# Altium schematic symbol library SCHLIB.SchLib: 2608 symbols (part 14 of 20) (continued)
## R-14R-0402 (continued)
RES 14 OHM 1% 1/16W 0402; Manufacturer Part Number: RC0402FR-0714RL; Manufacturer: YAGEO; Tolerance: 0.01; Power: 0.063W; Temperature Coefficient: ±100ppm/°C; Object  Type: Part; Design Item ID: R-14R-0402; Value: 14R; Composition: Thick Film; Features: Moisture Resistant; Operating Temperature: -55°C ~ 155°C; Height - Seated (Max): 0.40mm; Category: Resistor
footprint R0402
pins: 1, 2

## R-14R-0603
designator R?, comment Package: 0603  (hidden comment: 14R)
RES SMD 14 OHM 1% 1/10W 0603; Manufacturer Part Number: CRCW060314R0FKEA; Manufacturer: Vishay Dale; Tolerance: 0.01; Power: 0.1W; Temperature Coefficient: ±100ppm/°C; Object  Type: Part; Design Item ID: R-14R-0603; Value: 14R; Composition: Thick Film; Features: Automotive AEC-Q200; Operating Temperature: -55°C ~ 155°C; Height - Seated (Max): 0.50mm; Category: Resistor
footprint R0603
pins: 1, 2

## R-15.4K-0402
designator R?, comment Package: 0402  (hidden comment: 15.4K)
RES 15.4K OHM 1% 1/16W 0402; Manufacturer Part Number: RC0402FR-0715K4L; Manufacturer: YAGEO; Tolerance: 0.01; Power: 0.063W; Temperature Coefficient: ±100ppm/°C; Object  Type: Part; Design Item ID: R-15.4K-0402; Value: 15.4K; Composition: Thick Film; Features: Moisture Resistant; Operating Temperature: -55°C ~ 155°C; Height - Seated (Max): 0.40mm; Category: Resistor
footprint R0402
pins: 1, 2

## R-15.4K-0603
designator R?, comment Package: 0603  (hidden comment: 15.4K)
RES SMD 15.4K OHM 1% 1/10W 0603; Manufacturer Part Number: CRCW060315K4FKEA; Manufacturer: Vishay Dale; Tolerance: 0.01; Power: 0.1W; Temperature Coefficient: ±100ppm/°C; Object  Type: Part; Design Item ID: R-15.4K-0603; Value: 15.4K; Composition: Thick Film; Features: Automotive AEC-Q200; Operating Temperature: -55°C ~ 155°C; Height - Seated (Max): 0.50mm; Category: Resistor
footprint R0603
pins: 1, 2

## R-15.4R-0402
designator R?, comment Package: 0402  (hidden comment: 15.4R)
RES 15.4 OHM 1% 1/16W 0402; Manufacturer Part Number: RC0402FR-0715R4L; Manufacturer: YAGEO; Tolerance: 0.01; Power: 0.063W; Temperature Coefficient: ±100ppm/°C; Object  Type: Part; Design Item ID: R-15.4R-0402; Value: 15.4R; Composition: Thick Film; Features: Moisture Resistant; Operating Temperature: -55°C ~ 155°C; Height - Seated (Max): 0.40mm; Category: Resistor
footprint R0402
pins: 1, 2

## R-15.4R-0603
designator R?, comment Package: 0603  (hidden comment: 15.4R)
RES SMD 15.4 OHM 1% 1/10W 0603; Manufacturer Part Number: CRCW060315R4FKEA; Manufacturer: Vishay Dale; Tolerance: 0.01; Power: 0.1W; Temperature Coefficient: ±100ppm/°C; Object  Type: Part; Design Item ID: R-15.4R-0603; Value: 15.4R; Composition: Thick Film; Features: Automotive AEC-Q200; Operating Temperature: -55°C ~ 155°C; Height - Seated (Max): 0.50mm; Category: Resistor
footprint R0603
pins: 1, 2

## R-15.8K-0402
designator R?, comment Package: 0402  (hidden comment: 15.8K)
RES 15.8K OHM 1% 1/16W 0402; Manufacturer Part Number: RC0402FR-0715K8L; Manufacturer: YAGEO; Tolerance: 0.01; Power: 0.063W; Temperature Coefficient: ±100ppm/°C; Object  Type: Part; Design Item ID: R-15.8K-0402; Value: 15.8K; Composition: Thick Film; Features: Moisture Resistant; Operating Temperature: -55°C ~ 155°C; Height - Seated (Max): 0.40mm; Category: Resistor
footprint R0402
pins: 1, 2

## R-15.8K-0603
designator R?, comment Package: 0603  (hidden comment: 15.8K)
RES SMD 15.8K OHM 1% 1/10W 0603; Manufacturer Part Number: CRCW060315K8FKEA; Manufacturer: Vishay Dale; Tolerance: 0.01; Power: 0.1W; Temperature Coefficient: ±100ppm/°C; Object  Type: Part; Design Item ID: R-15.8K-0603; Value: 15.8K; Composition: Thick Film; Features: Automotive AEC-Q200; Operating Temperature: -55°C ~ 155°C; Height - Seated (Max): 0.50mm; Category: Resistor
footprint R0603
pins: 1, 2

## R-15.8R-0402
designator R?, comment Package: 0402  (hidden comment: 15.8R)
RES 15.8 OHM 1% 1/16W 0402; Manufacturer Part Number: RC0402FR-0715R8L; Manufacturer: YAGEO; Tolerance: 0.01; Power: 0.063W; Temperature Coefficient: ±100ppm/°C; Object  Type: Part; Design Item ID: R-15.8R-0402; Value: 15.8R; Composition: Thick Film; Features: Moisture Resistant; Operating Temperature: -55°C ~ 155°C; Height - Seated (Max): 0.40mm; Category: Resistor
footprint R0402
pins: 1, 2

## R-15K-0402
designator R?, comment Package: 0402  (hidden comment: 15K)
RES 15K OHM 1% 1/16W 0402; Manufacturer Part Number: RC0402FR-0715KL; Manufacturer: YAGEO; Tolerance: 0.01; Power: 0.063W; Temperature Coefficient: ±100ppm/°C; Object  Type: Part; Design Item ID: R-15K-0402; Value: 15K; Composition: Thick Film; Features: Moisture Resistant; Operating Temperature: -55°C ~ 155°C; Height - Seated (Max): 0.40mm; Category: Resistor
footprint R0402
pins: 1, 2

## R-15K-0603
designator R?, comment Package: 0603  (hidden comment: 15K)
RES SMD 15K OHM 1% 1/10W 0603; Manufacturer Part Number: CRCW060315K0FKEA; Manufacturer: Vishay Dale; Tolerance: 0.01; Power: 0.1W; Temperature Coefficient: ±100ppm/°C; Object  Type: Part; Design Item ID: R-15K-0603; Value: 15K; Composition: Thick Film; Features: Automotive AEC-Q200; Operating Temperature: -55°C ~ 155°C; Height - Seated (Max): 0.50mm; Category: Resistor
footprint R0603
pins: 1, 2

## R-15mR-1206
designator R?, comment Package: 1206  (hidden comment: 15mR)
RES 0.015 OHM 1% 1/4W 1206; Manufacturer Part Number: WSL1206R0150FEA; Manufacturer: Vishay Dale; Tolerance: 0.01; Power: 0.25W; Temperature Coefficient: ±75ppm/°C; Object  Type: Part; Design Item ID: R-15mR-1206; Value: 15mR; Composition: Metal Element; Features: Anti-Sulfur, Automotive AEC-Q200, Current Sense, Moisture Resistant, Pulse Withstanding; Operating Temperature: -65°C ~ 170°C; Height - Seated (Max): 0.89mm; Category: Resistor
footprint R1206
pins: 1, 2

## R-15mR-2512
designator R?, comment Package: 2512  (hidden comment: 15mR)
RES 0.015 OHM 1% 1W 2512; Manufacturer Part Number: WSL2512R0150FEA; Manufacturer: Vishay Dale; Tolerance: 0.01; Temperature Coefficient: ±75ppm/°C; Object  Type: Part; Design Item ID: R-15mR-2512; Value: 15mR; Power: 1W; Composition: Metal Element; Features: Anti-Sulfur, Automotive AEC-Q200, Current Sense, Moisture Resistant, Pulse Withstanding; Operating Temperature: -65°C ~ 170°C; Height - Seated (Max): 0.89mm; Category: Resistor
footprint R2512
pins: 1, 2

## R-15R-0402
designator R?, comment Package: 0402  (hidden comment: 15R)
RES 15 OHM 1% 1/16W 0402; Manufacturer Part Number: RC0402FR-0715RL; Manufacturer: YAGEO; Tolerance: 0.01; Power: 0.063W; Temperature Coefficient: ±100ppm/°C; Object  Type: Part; Design Item ID: R-15R-0402; Value: 15R; Composition: Thick Film; Features: Moisture Resistant; Operating Temperature: -55°C ~ 155°C; Height - Seated (Max): 0.40mm; Category: Resistor
footprint R0402
pins: 1, 2

## R-15R-0603
designator R?, comment Package: 0603  (hidden comment: 15R)
RES SMD 15 OHM 1% 1/10W 0603; Manufacturer Part Number: CRCW060315R0FKEA; Manufacturer: Vishay Dale; Tolerance: 0.01; Power: 0.1W; Temperature Coefficient: ±100ppm/°C; Object  Type: Part; Design Item ID: R-15R-0603; Value: 15R; Composition: Thick Film; Features: Automotive AEC-Q200; Operating Temperature: -55°C ~ 155°C; Height - Seated (Max): 0.50mm; Category: Resistor
footprint R0603
pins: 1, 2

## R-16.2K-0402
designator R?, comment Package: 0402  (hidden comment: 16.2K)
RES 16.2K OHM 1% 1/16W 0402; Manufacturer Part Number: RC0402FR-0716K2L; Manufacturer: YAGEO; Tolerance: 0.01; Power: 0.063W; Temperature Coefficient: ±100ppm/°C; Object  Type: Part; Design Item ID: R-16.2K-0402; Value: 16.2K; Composition: Thick Film; Features: Moisture Resistant; Operating Temperature: -55°C ~ 155°C; Height - Seated (Max): 0.40mm; Category: Resistor
footprint R0402
pins: 1, 2

## R-16.2K-0603
designator R?, comment Package: 0603  (hidden comment: 16.2K)
RES SMD 16.2K OHM 1% 1/10W 0603; Manufacturer Part Number: CRCW060316K2FKEA; Manufacturer: Vishay Dale; Tolerance: 0.01; Power: 0.1W; Temperature Coefficient: ±100ppm/°C; Object  Type: Part; Design Item ID: R-16.2K-0603; Value: 16.2K; Composition: Thick Film; Features: Automotive AEC-Q200; Operating Temperature: -55°C ~ 155°C; Height - Seated (Max): 0.50mm; Category: Resistor
footprint R0603
pins: 1, 2

## R-16.2R-0402
designator R?, comment Package: 0402  (hidden comment: 16.2R)
RES 16.2 OHM 1% 1/16W 0402; Manufacturer Part Number: RC0402FR-0716R2L; Manufacturer: YAGEO; Tolerance: 0.01; Power: 0.063W; Temperature Coefficient: ±100ppm/°C; Object  Type: Part; Design Item ID: R-16.2R-0402; Value: 16.2R; Composition: Thick Film; Features: Moisture Resistant; Operating Temperature: -55°C ~ 155°C; Height - Seated (Max): 0.40mm; Category: Resistor
footprint R0402
pins: 1, 2

## R-16.2R-0603
designator R?, comment Package: 0603  (hidden comment: 16.2R)
RES SMD 16.2 OHM 1% 1/10W 0603; Manufacturer Part Number: CRCW060316R2FKEA; Manufacturer: Vishay Dale; Tolerance: 0.01; Power: 0.1W; Temperature Coefficient: ±100ppm/°C; Object  Type: Part; Design Item ID: R-16.2R-0603; Value: 16.2R; Composition: Thick Film; Features: Automotive AEC-Q200; Operating Temperature: -55°C ~ 155°C; Height - Seated (Max): 0.50mm; Category: Resistor
footprint R0603
pins: 1, 2

## R-16.5K-0402
designator R?, comment Package: 0402  (hidden comment: 16.5K)
RES 16.5K OHM 1% 1/16W 0402; Manufacturer Part Number: RC0402FR-0716K5L; Manufacturer: YAGEO; Tolerance: 0.01; Power: 0.063W; Temperature Coefficient: ±100ppm/°C; Object  Type: Part; Design Item ID: R-16.5K-0402; Value: 16.5K; Composition: Thick Film; Features: Moisture Resistant; Operating Temperature: -55°C ~ 155°C; Height - Seated (Max): 0.40mm; Category: Resistor
footprint R0402
pins: 1, 2

## R-16.5K-0603
designator R?, comment Package: 0603  (hidden comment: 16.5K)
RES SMD 16.5K OHM 1% 1/10W 0603; Manufacturer Part Number: CRCW060316K5FKEA; Manufacturer: Vishay Dale; Tolerance: 0.01; Power: 0.1W; Temperature Coefficient: ±100ppm/°C; Object  Type: Part; Design Item ID: R-16.5K-0603; Value: 16.5K; Composition: Thick Film; Features: Automotive AEC-Q200; Operating Temperature: -55°C ~ 155°C; Height - Seated (Max): 0.50mm; Category: Resistor
footprint R0603
pins: 1, 2

## R-16.5R-0402
designator R?, comment Package: 0402  (hidden comment: 16.5R)
RES 16.5 OHM 1% 1/16W 0402; Manufacturer Part Number: RC0402FR-0716R5L; Manufacturer: YAGEO; Tolerance: 0.01; Power: 0.063W; Temperature Coefficient: ±100ppm/°C; Object  Type: Part; Design Item ID: R-16.5R-0402; Value: 16.5R; Composition: Thick Film; Features: Moisture Resistant; Operating Temperature: -55°C ~ 155°C; Height - Seated (Max): 0.40mm; Category: Resistor
footprint R0402
pins: 1, 2

## R-16.5R-0603
designator R?, comment Package: 0603  (hidden comment: 16.5R)
RES SMD 16.5 OHM 1% 1/10W 0603; Manufacturer Part Number: CRCW060316R5FKEA; Manufacturer: Vishay Dale; Tolerance: 0.01; Power: 0.1W; Temperature Coefficient: ±100ppm/°C; Object  Type: Part; Design Item ID: R-16.5R-0603; Value: 16.5R; Composition: Thick Film; Features: Automotive AEC-Q200; Operating Temperature: -55°C ~ 155°C; Height - Seated (Max): 0.50mm; Category: Resistor
footprint R0603
pins: 1, 2

## R-16.9K-0402
designator R?, comment Package: 0402  (hidden comment: 16.9K)
RES 16.9K OHM 1% 1/16W 0402; Manufacturer Part Number: RC0402FR-0716K9L; Manufacturer: YAGEO; Tolerance: 0.01; Power: 0.063W; Temperature Coefficient: ±100ppm/°C; Object  Type: Part; Design Item ID: R-16.9K-0402; Value: 16.9K; Composition: Thick Film; Features: Moisture Resistant; Operating Temperature: -55°C ~ 155°C; Height - Seated (Max): 0.40mm; Category: Resistor
footprint R0402
pins: 1, 2

## R-16.9K-0603
designator R?, comment Package: 0603  (hidden comment: 16.9K)
RES SMD 16.9K OHM 1% 1/10W 0603; Manufacturer Part Number: CRCW060316K9FKEA; Manufacturer: Vishay Dale; Tolerance: 0.01; Power: 0.1W; Temperature Coefficient: ±100ppm/°C; Object  Type: Part; Design Item ID: R-16.9K-0603; Value: 16.9K; Composition: Thick Film; Features: Automotive AEC-Q200; Operating Temperature: -55°C ~ 155°C; Height - Seated (Max): 0.50mm; Category: Resistor
footprint R0603
pins: 1, 2

## R-16.9R-0402
designator R?, comment Package: 0402  (hidden comment: 16.9R)
RES 16.9 OHM 1% 1/16W 0402; Manufacturer Part Number: RC0402FR-0716R9L; Manufacturer: YAGEO; Tolerance: 0.01; Power: 0.063W; Temperature Coefficient: ±100ppm/°C; Object  Type: Part; Design Item ID: R-16.9R-0402; Value: 16.9R; Composition: Thick Film; Features: Moisture Resistant; Operating Temperature: -55°C ~ 155°C; Height - Seated (Max): 0.40mm; Category: Resistor
footprint R0402
pins: 1, 2

## R-16.9R-0603
designator R?, comment Package: 0603  (hidden comment: 16.9R)
RES SMD 16.9 OHM 1% 1/10W 0603; Manufacturer Part Number: CRCW060316R9FKEA; Manufacturer: Vishay Dale; Tolerance: 0.01; Power: 0.1W; Temperature Coefficient: ±100ppm/°C; Object  Type: Part; Design Item ID: R-16.9R-0603; Value: 16.9R; Composition: Thick Film; Features: Automotive AEC-Q200; Operating Temperature: -55°C ~ 155°C; Height - Seated (Max): 0.50mm; Category: Resistor
footprint R0603
pins: 1, 2

## R-16K-0402
designator R?, comment Package: 0402  (hidden comment: 16K)
RES 16K OHM 1% 1/16W 0402; Manufacturer Part Number: RC0402FR-0716KL; Manufacturer: YAGEO; Tolerance: 0.01; Power: 0.063W; Temperature Coefficient: ±100ppm/°C; Object  Type: Part; Design Item ID: R-16K-0402; Value: 16K; Composition: Thick Film; Features: Moisture Resistant; Operating Temperature: -55°C ~ 155°C; Height - Seated (Max): 0.40mm; Category: Resistor
footprint R0402
pins: 1, 2

## R-16K-0603
designator R?, comment Package: 0603  (hidden comment: 16K)
RES SMD 16K OHM 1% 1/10W 0603; Manufacturer Part Number: CRCW060316K0FKEA; Manufacturer: Vishay Dale; Tolerance: 0.01; Power: 0.1W; Temperature Coefficient: ±100ppm/°C; Object  Type: Part; Design Item ID: R-16K-0603; Value: 16K; Composition: Thick Film; Features: Automotive AEC-Q200; Operating Temperature: -55°C ~ 155°C; Height - Seated (Max): 0.50mm; Category: Resistor
footprint R0603
pins: 1, 2

## R-16mR-2512
designator R?, comment Package: 2512  (hidden comment: 16mR)
RES 0.016 OHM 1% 1W 2512; Manufacturer Part Number: WSL2512R0160FEA; Manufacturer: Vishay Dale; Tolerance: 0.01; Temperature Coefficient: ±75ppm/°C; Object  Type: Part; Design Item ID: R-16mR-2512; Value: 16mR; Power: 1W; Composition: Metal Element; Features: Anti-Sulfur, Automotive AEC-Q200, Current Sense, Moisture Resistant, Pulse Withstanding; Operating Temperature: -65°C ~ 170°C; Height - Seated (Max): 0.89mm; Category: Resistor
footprint R2512
pins: 1, 2

## R-16R-0402
designator R?, comment Package: 0402  (hidden comment: 16R)
RES 16 OHM 1% 1/16W 0402; Manufacturer Part Number: RC0402FR-0716RL; Manufacturer: YAGEO; Tolerance: 0.01; Power: 0.063W; Temperature Coefficient: ±100ppm/°C; Object  Type: Part; Design Item ID: R-16R-0402; Value: 16R; Composition: Thick Film; Features: Moisture Resistant; Operating Temperature: -55°C ~ 155°C; Height - Seated (Max): 0.40mm; Category: Resistor
footprint R0402
pins: 1, 2

## R-16R-0603
designator R?, comment Package: 0603  (hidden comment: 16R)
RES SMD 16 OHM 1% 1/10W 0603; Manufacturer Part Number: CRCW060316R0FKEA; Manufacturer: Vishay Dale; Tolerance: 0.01; Power: 0.1W; Temperature Coefficient: ±100ppm/°C; Object  Type: Part; Design Item ID: R-16R-0603; Value: 16R; Composition: Thick Film; Features: Automotive AEC-Q200; Operating Temperature: -55°C ~ 155°C; Height - Seated (Max): 0.50mm; Category: Resistor
footprint R0603
pins: 1, 2

## R-17.4K-0402
designator R?, comment Package: 0402  (hidden comment: 17.4K)
RES 17.4K OHM 1% 1/16W 0402; Manufacturer Part Number: RC0402FR-0717K4L; Manufacturer: YAGEO; Tolerance: 0.01; Power: 0.063W; Temperature Coefficient: ±100ppm/°C; Object  Type: Part; Design Item ID: R-17.4K-0402; Value: 17.4K; Composition: Thick Film; Features: Moisture Resistant; Operating Temperature: -55°C ~ 155°C; Height - Seated (Max): 0.40mm; Category: Resistor
footprint R0402
pins: 1, 2

## R-17.4K-0603
designator R?, comment Package: 0603  (hidden comment: 17.4K)
RES SMD 17.4K OHM 1% 1/10W 0603; Manufacturer Part Number: CRCW060317K4FKEA; Manufacturer: Vishay Dale; Tolerance: 0.01; Power: 0.1W; Temperature Coefficient: ±100ppm/°C; Object  Type: Part; Design Item ID: R-17.4K-0603; Value: 17.4K; Composition: Thick Film; Features: Automotive AEC-Q200; Operating Temperature: -55°C ~ 155°C; Height - Seated (Max): 0.50mm; Category: Resistor
footprint R0603
pins: 1, 2

## R-17.4R-0402
designator R?, comment Package: 0402  (hidden comment: 17.4R)
RES 17.4 OHM 1% 1/16W 0402; Manufacturer Part Number: RC0402FR-0717R4L; Manufacturer: YAGEO; Tolerance: 0.01; Power: 0.063W; Temperature Coefficient: ±100ppm/°C; Object  Type: Part; Design Item ID: R-17.4R-0402; Value: 17.4R; Composition: Thick Film; Features: Moisture Resistant; Operating Temperature: -55°C ~ 155°C; Height - Seated (Max): 0.40mm; Category: Resistor
footprint R0402
pins: 1, 2

## R-17.4R-0603
designator R?, comment Package: 0603  (hidden comment: 17.4R)
RES SMD 17.4 OHM 1% 1/10W 0603; Manufacturer Part Number: CRCW060317R4FKEA; Manufacturer: Vishay Dale; Tolerance: 0.01; Power: 0.1W; Temperature Coefficient: ±100ppm/°C; Object  Type: Part; Design Item ID: R-17.4R-0603; Value: 17.4R; Composition: Thick Film; Features: Automotive AEC-Q200; Operating Temperature: -55°C ~ 155°C; Height - Seated (Max): 0.50mm; Category: Resistor
footprint R0603
pins: 1, 2

## R-17.8K-0402
designator R?, comment Package: 0402  (hidden comment: 17.8K)
RES 17.8K OHM 1% 1/16W 0402; Manufacturer Part Number: RC0402FR-0717K8L; Manufacturer: YAGEO; Tolerance: 0.01; Power: 0.063W; Temperature Coefficient: ±100ppm/°C; Object  Type: Part; Design Item ID: R-17.8K-0402; Value: 17.8K; Composition: Thick Film; Features: Moisture Resistant; Operating Temperature: -55°C ~ 155°C; Height - Seated (Max): 0.40mm; Category: Resistor
footprint R0402
pins: 1, 2

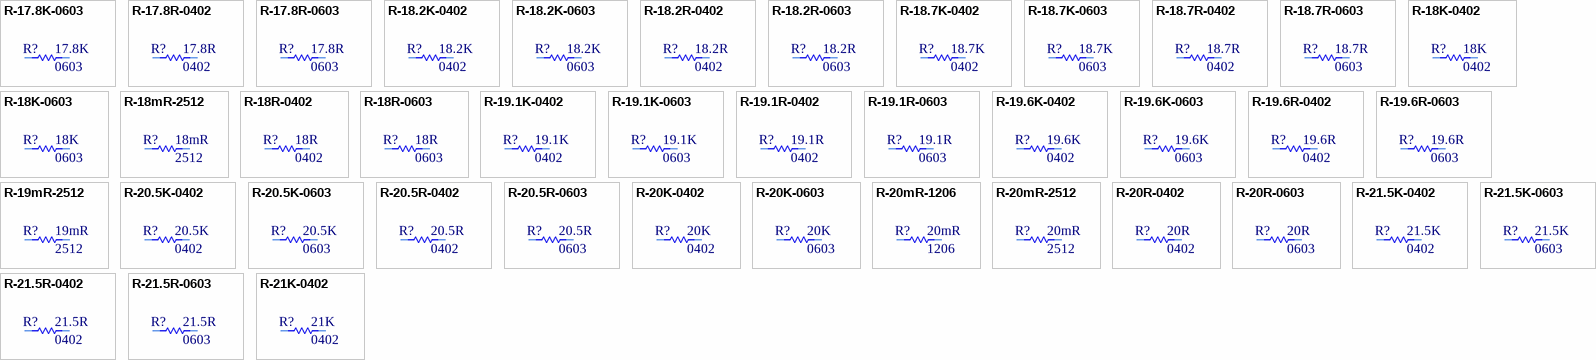
[diagram p60: symbols R-17.8K-0603 to R-21K-0402]

## R-17.8K-0603
designator R?, comment Package: 0603  (hidden comment: 17.8K)
RES SMD 17.8K OHM 1% 1/10W 0603; Manufacturer Part Number: CRCW060317K8FKEA; Manufacturer: Vishay Dale; Tolerance: 0.01; Power: 0.1W; Temperature Coefficient: ±100ppm/°C; Object  Type: Part; Design Item ID: R-17.8K-0603; Value: 17.8K; Composition: Thick Film; Features: Automotive AEC-Q200; Operating Temperature: -55°C ~ 155°C; Height - Seated (Max): 0.50mm; Category: Resistor
footprint R0603
pins: 1, 2

## R-17.8R-0402
designator R?, comment Package: 0402  (hidden comment: 17.8R)
RES 17.8 OHM 1% 1/16W 0402; Manufacturer Part Number: RC0402FR-0717R8L; Manufacturer: YAGEO; Tolerance: 0.01; Power: 0.063W; Temperature Coefficient: ±100ppm/°C; Object  Type: Part; Design Item ID: R-17.8R-0402; Value: 17.8R; Composition: Thick Film; Features: Moisture Resistant; Operating Temperature: -55°C ~ 155°C; Height - Seated (Max): 0.40mm; Category: Resistor
footprint R0402
pins: 1, 2

## R-17.8R-0603
designator R?, comment Package: 0603  (hidden comment: 17.8R)
RES SMD 17.8 OHM 1% 1/10W 0603; Manufacturer Part Number: CRCW060317R8FKEA; Manufacturer: Vishay Dale; Tolerance: 0.01; Power: 0.1W; Temperature Coefficient: ±100ppm/°C; Object  Type: Part; Design Item ID: R-17.8R-0603; Value: 17.8R; Composition: Thick Film; Features: Automotive AEC-Q200; Operating Temperature: -55°C ~ 155°C; Height - Seated (Max): 0.50mm; Category: Resistor
footprint R0603
pins: 1, 2

## R-18.2K-0402
designator R?, comment Package: 0402  (hidden comment: 18.2K)
RES 18.2K OHM 1% 1/16W 0402; Manufacturer Part Number: RC0402FR-0718K2L; Manufacturer: YAGEO; Tolerance: 0.01; Power: 0.063W; Temperature Coefficient: ±100ppm/°C; Object  Type: Part; Design Item ID: R-18.2K-0402; Value: 18.2K; Composition: Thick Film; Features: Moisture Resistant; Operating Temperature: -55°C ~ 155°C; Height - Seated (Max): 0.40mm; Category: Resistor
footprint R0402
pins: 1, 2

## R-18.2K-0603
designator R?, comment Package: 0603  (hidden comment: 18.2K)
RES SMD 18.2K OHM 1% 1/10W 0603; Manufacturer Part Number: CRCW060318K2FKEA; Manufacturer: Vishay Dale; Tolerance: 0.01; Power: 0.1W; Temperature Coefficient: ±100ppm/°C; Object  Type: Part; Design Item ID: R-18.2K-0603; Value: 18.2K; Composition: Thick Film; Features: Automotive AEC-Q200; Operating Temperature: -55°C ~ 155°C; Height - Seated (Max): 0.50mm; Category: Resistor
footprint R0603
pins: 1, 2

## R-18.2R-0402
designator R?, comment Package: 0402  (hidden comment: 18.2R)
RES 18.2 OHM 1% 1/16W 0402; Manufacturer Part Number: RC0402FR-0718R2L; Manufacturer: YAGEO; Tolerance: 0.01; Power: 0.063W; Temperature Coefficient: ±100ppm/°C; Object  Type: Part; Design Item ID: R-18.2R-0402; Value: 18.2R; Composition: Thick Film; Features: Moisture Resistant; Operating Temperature: -55°C ~ 155°C; Height - Seated (Max): 0.40mm; Category: Resistor
footprint R0402
pins: 1, 2

## R-18.2R-0603
designator R?, comment Package: 0603  (hidden comment: 18.2R)
RES SMD 18.2 OHM 1% 1/10W 0603; Manufacturer Part Number: CRCW060318R2FKEA; Manufacturer: Vishay Dale; Tolerance: 0.01; Power: 0.1W; Temperature Coefficient: ±100ppm/°C; Object  Type: Part; Design Item ID: R-18.2R-0603; Value: 18.2R; Composition: Thick Film; Features: Automotive AEC-Q200; Operating Temperature: -55°C ~ 155°C; Height - Seated (Max): 0.50mm; Category: Resistor
footprint R0603
pins: 1, 2

## R-18.7K-0402
designator R?, comment Package: 0402  (hidden comment: 18.7K)
RES 18.7K OHM 1% 1/16W 0402; Manufacturer Part Number: RC0402FR-0718K7L; Manufacturer: YAGEO; Tolerance: 0.01; Power: 0.063W; Temperature Coefficient: ±100ppm/°C; Object  Type: Part; Design Item ID: R-18.7K-0402; Value: 18.7K; Composition: Thick Film; Features: Moisture Resistant; Operating Temperature: -55°C ~ 155°C; Height - Seated (Max): 0.40mm; Category: Resistor
footprint R0402
pins: 1, 2

## R-18.7K-0603
designator R?, comment Package: 0603  (hidden comment: 18.7K)
RES SMD 18.7K OHM 1% 1/10W 0603; Manufacturer Part Number: CRCW060318K7FKEA; Manufacturer: Vishay Dale; Tolerance: 0.01; Power: 0.1W; Temperature Coefficient: ±100ppm/°C; Object  Type: Part; Design Item ID: R-18.7K-0603; Value: 18.7K; Composition: Thick Film; Features: Automotive AEC-Q200; Operating Temperature: -55°C ~ 155°C; Height - Seated (Max): 0.50mm; Category: Resistor
footprint R0603
pins: 1, 2

## R-18.7R-0402
designator R?, comment Package: 0402  (hidden comment: 18.7R)
RES 18.7 OHM 1% 1/16W 0402; Manufacturer Part Number: RC0402FR-0718R7L; Manufacturer: YAGEO; Tolerance: 0.01; Power: 0.063W; Temperature Coefficient: ±100ppm/°C; Object  Type: Part; Design Item ID: R-18.7R-0402; Value: 18.7R; Composition: Thick Film; Features: Moisture Resistant; Operating Temperature: -55°C ~ 155°C; Height - Seated (Max): 0.40mm; Category: Resistor
footprint R0402
pins: 1, 2

## R-18.7R-0603
designator R?, comment Package: 0603  (hidden comment: 18.7R)
RES SMD 18.7 OHM 1% 1/10W 0603; Manufacturer Part Number: CRCW060318R7FKEA; Manufacturer: Vishay Dale; Tolerance: 0.01; Power: 0.1W; Temperature Coefficient: ±100ppm/°C; Object  Type: Part; Design Item ID: R-18.7R-0603; Value: 18.7R; Composition: Thick Film; Features: Automotive AEC-Q200; Operating Temperature: -55°C ~ 155°C; Height - Seated (Max): 0.50mm; Category: Resistor
footprint R0603
pins: 1, 2

## R-18K-0402
designator R?, comment Package: 0402  (hidden comment: 18K)
RES 18K OHM 1% 1/16W 0402; Manufacturer Part Number: RC0402FR-0718KL; Manufacturer: YAGEO; Tolerance: 0.01; Power: 0.063W; Temperature Coefficient: ±100ppm/°C; Object  Type: Part; Design Item ID: R-18K-0402; Value: 18K; Composition: Thick Film; Features: Moisture Resistant; Operating Temperature: -55°C ~ 155°C; Height - Seated (Max): 0.40mm; Category: Resistor
footprint R0402
pins: 1, 2

## R-18K-0603
designator R?, comment Package: 0603  (hidden comment: 18K)
RES SMD 18K OHM 1% 1/10W 0603; Manufacturer Part Number: CRCW060318K0FKEA; Manufacturer: Vishay Dale; Tolerance: 0.01; Power: 0.1W; Temperature Coefficient: ±100ppm/°C; Object  Type: Part; Design Item ID: R-18K-0603; Value: 18K; Composition: Thick Film; Features: Automotive AEC-Q200; Operating Temperature: -55°C ~ 155°C; Height - Seated (Max): 0.50mm; Category: Resistor
footprint R0603
pins: 1, 2

## R-18mR-2512
designator R?, comment Package: 2512  (hidden comment: 18mR)
RES 0.018 OHM 1% 1W 2512; Manufacturer Part Number: WSL2512R0180FEA; Manufacturer: Vishay Dale; Tolerance: 0.01; Temperature Coefficient: ±75ppm/°C; Object  Type: Part; Design Item ID: R-18mR-2512; Value: 18mR; Power: 1W; Composition: Metal Element; Features: Anti-Sulfur, Automotive AEC-Q200, Current Sense, Moisture Resistant, Pulse Withstanding; Operating Temperature: -65°C ~ 170°C; Height - Seated (Max): 0.89mm; Category: Resistor
footprint R2512
pins: 1, 2

## R-18R-0402
designator R?, comment Package: 0402  (hidden comment: 18R)
RES 18 OHM 1% 1/16W 0402; Manufacturer Part Number: RC0402FR-0718RL; Manufacturer: YAGEO; Tolerance: 0.01; Power: 0.063W; Temperature Coefficient: ±100ppm/°C; Object  Type: Part; Design Item ID: R-18R-0402; Value: 18R; Composition: Thick Film; Features: Moisture Resistant; Operating Temperature: -55°C ~ 155°C; Height - Seated (Max): 0.40mm; Category: Resistor
footprint R0402
pins: 1, 2

## R-18R-0603
designator R?, comment Package: 0603  (hidden comment: 18R)
RES SMD 18 OHM 1% 1/10W 0603; Manufacturer Part Number: CRCW060318R0FKEA; Manufacturer: Vishay Dale; Tolerance: 0.01; Power: 0.1W; Temperature Coefficient: ±100ppm/°C; Object  Type: Part; Design Item ID: R-18R-0603; Value: 18R; Composition: Thick Film; Features: Automotive AEC-Q200; Operating Temperature: -55°C ~ 155°C; Height - Seated (Max): 0.50mm; Category: Resistor
footprint R0603
pins: 1, 2

## R-19.1K-0402
designator R?, comment Package: 0402  (hidden comment: 19.1K)
RES 19.1K OHM 1% 1/16W 0402; Manufacturer Part Number: RC0402FR-0719K1L; Manufacturer: YAGEO; Tolerance: 0.01; Power: 0.063W; Temperature Coefficient: ±100ppm/°C; Object  Type: Part; Design Item ID: R-19.1K-0402; Value: 19.1K; Composition: Thick Film; Features: Moisture Resistant; Operating Temperature: -55°C ~ 155°C; Height - Seated (Max): 0.40mm; Category: Resistor
footprint R0402
pins: 1, 2

## R-19.1K-0603
designator R?, comment Package: 0603  (hidden comment: 19.1K)
RES SMD 19.1K OHM 1% 1/10W 0603; Manufacturer Part Number: CRCW060319K1FKEA; Manufacturer: Vishay Dale; Tolerance: 0.01; Power: 0.1W; Temperature Coefficient: ±100ppm/°C; Object  Type: Part; Design Item ID: R-19.1K-0603; Value: 19.1K; Composition: Thick Film; Features: Automotive AEC-Q200; Operating Temperature: -55°C ~ 155°C; Height - Seated (Max): 0.50mm; Category: Resistor
footprint R0603
pins: 1, 2

## R-19.1R-0402
designator R?, comment Package: 0402  (hidden comment: 19.1R)
RES 19.1 OHM 1% 1/16W 0402; Manufacturer Part Number: RC0402FR-0719R1L; Manufacturer: YAGEO; Tolerance: 0.01; Power: 0.063W; Temperature Coefficient: ±100ppm/°C; Object  Type: Part; Design Item ID: R-19.1R-0402; Value: 19.1R; Composition: Thick Film; Features: Moisture Resistant; Operating Temperature: -55°C ~ 155°C; Height - Seated (Max): 0.40mm; Category: Resistor
footprint R0402
pins: 1, 2

## R-19.1R-0603
designator R?, comment Package: 0603  (hidden comment: 19.1R)
RES SMD 19.1 OHM 1% 1/10W 0603; Manufacturer Part Number: CRCW060319R1FKEA; Manufacturer: Vishay Dale; Tolerance: 0.01; Power: 0.1W; Temperature Coefficient: ±100ppm/°C; Object  Type: Part; Design Item ID: R-19.1R-0603; Value: 19.1R; Composition: Thick Film; Features: Automotive AEC-Q200; Operating Temperature: -55°C ~ 155°C; Height - Seated (Max): 0.50mm; Category: Resistor
footprint R0603
pins: 1, 2

## R-19.6K-0402
designator R?, comment Package: 0402  (hidden comment: 19.6K)
RES 19.6K OHM 1% 1/16W 0402; Manufacturer Part Number: RC0402FR-0719K6L; Manufacturer: YAGEO; Tolerance: 0.01; Power: 0.063W; Temperature Coefficient: ±100ppm/°C; Object  Type: Part; Design Item ID: R-19.6K-0402; Value: 19.6K; Composition: Thick Film; Features: Moisture Resistant; Operating Temperature: -55°C ~ 155°C; Height - Seated (Max): 0.40mm; Category: Resistor
footprint R0402
pins: 1, 2

## R-19.6K-0603
designator R?, comment Package: 0603  (hidden comment: 19.6K)
RES SMD 19.6K OHM 1% 1/10W 0603; Manufacturer Part Number: CRCW060319K6FKEA; Manufacturer: Vishay Dale; Tolerance: 0.01; Power: 0.1W; Temperature Coefficient: ±100ppm/°C; Object  Type: Part; Design Item ID: R-19.6K-0603; Value: 19.6K; Composition: Thick Film; Features: Automotive AEC-Q200; Operating Temperature: -55°C ~ 155°C; Height - Seated (Max): 0.50mm; Category: Resistor
footprint R0603
pins: 1, 2

## R-19.6R-0402
designator R?, comment Package: 0402  (hidden comment: 19.6R)
RES 19.6 OHM 1% 1/16W 0402; Manufacturer Part Number: RC0402FR-0719R6L; Manufacturer: YAGEO; Tolerance: 0.01; Power: 0.063W; Temperature Coefficient: ±100ppm/°C; Object  Type: Part; Design Item ID: R-19.6R-0402; Value: 19.6R; Composition: Thick Film; Features: Moisture Resistant; Operating Temperature: -55°C ~ 155°C; Height - Seated (Max): 0.40mm; Category: Resistor
footprint R0402
pins: 1, 2

## R-19.6R-0603
designator R?, comment Package: 0603  (hidden comment: 19.6R)
RES SMD 19.6 OHM 1% 1/10W 0603; Manufacturer Part Number: CRCW060319R6FKEA; Manufacturer: Vishay Dale; Tolerance: 0.01; Power: 0.1W; Temperature Coefficient: ±100ppm/°C; Object  Type: Part; Design Item ID: R-19.6R-0603; Value: 19.6R; Composition: Thick Film; Features: Automotive AEC-Q200; Operating Temperature: -55°C ~ 155°C; Height - Seated (Max): 0.50mm; Category: Resistor
footprint R0603
pins: 1, 2

## R-19mR-2512
designator R?, comment Package: 2512  (hidden comment: 19mR)
RES 0.019 OHM 1% 1W 2512; Manufacturer Part Number: WSL2512R0190FEA; Manufacturer: Vishay Dale; Tolerance: 0.01; Temperature Coefficient: ±75ppm/°C; Object  Type: Part; Design Item ID: R-19mR-2512; Value: 19mR; Power: 1W; Composition: Metal Element; Features: Anti-Sulfur, Automotive AEC-Q200, Current Sense, Moisture Resistant, Pulse Withstanding; Operating Temperature: -65°C ~ 170°C; Height - Seated (Max): 0.89mm; Category: Resistor
footprint R2512
pins: 1, 2

## R-20.5K-0402
designator R?, comment Package: 0402  (hidden comment: 20.5K)
RES 20.5K OHM 1% 1/16W 0402; Manufacturer Part Number: RC0402FR-0720K5L; Manufacturer: YAGEO; Tolerance: 0.01; Power: 0.063W; Temperature Coefficient: ±100ppm/°C; Object  Type: Part; Design Item ID: R-20.5K-0402; Value: 20.5K; Composition: Thick Film; Features: Moisture Resistant; Operating Temperature: -55°C ~ 155°C; Height - Seated (Max): 0.40mm; Category: Resistor
footprint R0402
pins: 1, 2

## R-20.5K-0603
designator R?, comment Package: 0603  (hidden comment: 20.5K)
RES SMD 20.5K OHM 1% 1/10W 0603; Manufacturer Part Number: CRCW060320K5FKEA; Manufacturer: Vishay Dale; Tolerance: 0.01; Power: 0.1W; Temperature Coefficient: ±100ppm/°C; Object  Type: Part; Design Item ID: R-20.5K-0603; Value: 20.5K; Composition: Thick Film; Features: Automotive AEC-Q200; Operating Temperature: -55°C ~ 155°C; Height - Seated (Max): 0.50mm; Category: Resistor
footprint R0603
pins: 1, 2

## R-20.5R-0402
designator R?, comment Package: 0402  (hidden comment: 20.5R)
RES 20.5 OHM 1% 1/16W 0402; Manufacturer Part Number: RC0402FR-0720R5L; Manufacturer: YAGEO; Tolerance: 0.01; Power: 0.063W; Temperature Coefficient: ±100ppm/°C; Object  Type: Part; Design Item ID: R-20.5R-0402; Value: 20.5R; Composition: Thick Film; Features: Moisture Resistant; Operating Temperature: -55°C ~ 155°C; Height - Seated (Max): 0.40mm; Category: Resistor
footprint R0402
pins: 1, 2

## R-20.5R-0603
designator R?, comment Package: 0603  (hidden comment: 20.5R)
RES SMD 20.5 OHM 1% 1/10W 0603; Manufacturer Part Number: CRCW060320R5FKEA; Manufacturer: Vishay Dale; Tolerance: 0.01; Power: 0.1W; Temperature Coefficient: ±100ppm/°C; Object  Type: Part; Design Item ID: R-20.5R-0603; Value: 20.5R; Composition: Thick Film; Features: Automotive AEC-Q200; Operating Temperature: -55°C ~ 155°C; Height - Seated (Max): 0.50mm; Category: Resistor
footprint R0603
pins: 1, 2

## R-20K-0402
designator R?, comment Package: 0402  (hidden comment: 20K)
RES 20K OHM 1% 1/16W 0402; Manufacturer Part Number: RC0402FR-0720KL; Manufacturer: YAGEO; Tolerance: 0.01; Power: 0.063W; Temperature Coefficient: ±100ppm/°C; Object  Type: Part; Design Item ID: R-20K-0402; Value: 20K; Composition: Thick Film; Features: Moisture Resistant; Operating Temperature: -55°C ~ 155°C; Height - Seated (Max): 0.40mm; Category: Resistor
footprint R0402
pins: 1, 2

## R-20K-0603
designator R?, comment Package: 0603  (hidden comment: 20K)
RES SMD 20K OHM 1% 1/10W 0603; Manufacturer Part Number: CRCW060320K0FKEA; Manufacturer: Vishay Dale; Tolerance: 0.01; Power: 0.1W; Temperature Coefficient: ±100ppm/°C; Object  Type: Part; Design Item ID: R-20K-0603; Value: 20K; Composition: Thick Film; Features: Automotive AEC-Q200; Operating Temperature: -55°C ~ 155°C; Height - Seated (Max): 0.50mm; Category: Resistor
footprint R0603
pins: 1, 2

## R-20mR-1206
designator R?, comment Package: 1206  (hidden comment: 20mR)
RES 0.02 OHM 1% 1/4W 1206; Manufacturer Part Number: WSL1206R0200FEA; Manufacturer: Vishay Dale; Tolerance: 0.01; Power: 0.25W; Temperature Coefficient: ±75ppm/°C; Object  Type: Part; Design Item ID: R-20mR-1206; Value: 20mR; Composition: Metal Element; Features: Anti-Sulfur, Automotive AEC-Q200, Current Sense, Moisture Resistant, Pulse Withstanding; Operating Temperature: -65°C ~ 170°C; Height - Seated (Max): 0.89mm; Category: Resistor
footprint R1206
pins: 1, 2

## R-20mR-2512
designator R?, comment Package: 2512  (hidden comment: 20mR)
RES 0.02 OHM 1% 1W 2512; Manufacturer Part Number: WSL2512R0200FEA; Manufacturer: Vishay Dale; Tolerance: 0.01; Temperature Coefficient: ±75ppm/°C; Object  Type: Part; Design Item ID: R-20mR-2512; Value: 20mR; Power: 1W; Composition: Metal Element; Features: Anti-Sulfur, Automotive AEC-Q200, Current Sense, Moisture Resistant, Pulse Withstanding; Operating Temperature: -65°C ~ 170°C; Height - Seated (Max): 0.89mm; Category: Resistor
footprint R2512
pins: 1, 2

## R-20R-0402
designator R?, comment Package: 0402  (hidden comment: 20R)
RES 20 OHM 1% 1/16W 0402; Manufacturer Part Number: RC0402FR-0720RL; Manufacturer: YAGEO; Tolerance: 0.01; Power: 0.063W; Temperature Coefficient: ±100ppm/°C; Object  Type: Part; Design Item ID: R-20R-0402; Value: 20R; Composition: Thick Film; Features: Moisture Resistant; Operating Temperature: -55°C ~ 155°C; Height - Seated (Max): 0.40mm; Category: Resistor
footprint R0402
pins: 1, 2

## R-20R-0603
designator R?, comment Package: 0603  (hidden comment: 20R)
RES SMD 20 OHM 1% 1/10W 0603; Manufacturer Part Number: CRCW060320R0FKEA; Manufacturer: Vishay Dale; Tolerance: 0.01; Power: 0.1W; Temperature Coefficient: ±100ppm/°C; Object  Type: Part; Design Item ID: R-20R-0603; Value: 20R; Composition: Thick Film; Features: Automotive AEC-Q200; Operating Temperature: -55°C ~ 155°C; Height - Seated (Max): 0.50mm; Category: Resistor
footprint R0603
pins: 1, 2

## R-21.5K-0402
designator R?, comment Package: 0402  (hidden comment: 21.5K)
RES 21.5K OHM 1% 1/16W 0402; Manufacturer Part Number: RC0402FR-0721K5L; Manufacturer: YAGEO; Tolerance: 0.01; Power: 0.063W; Temperature Coefficient: ±100ppm/°C; Object  Type: Part; Design Item ID: R-21.5K-0402; Value: 21.5K; Composition: Thick Film; Features: Moisture Resistant; Operating Temperature: -55°C ~ 155°C; Height - Seated (Max): 0.40mm; Category: Resistor
footprint R0402
pins: 1, 2

## R-21.5K-0603
designator R?, comment Package: 0603  (hidden comment: 21.5K)
RES SMD 21.5K OHM 1% 1/10W 0603; Manufacturer Part Number: CRCW060321K5FKEA; Manufacturer: Vishay Dale; Tolerance: 0.01; Power: 0.1W; Temperature Coefficient: ±100ppm/°C; Object  Type: Part; Design Item ID: R-21.5K-0603; Value: 21.5K; Composition: Thick Film; Features: Automotive AEC-Q200; Operating Temperature: -55°C ~ 155°C; Height - Seated (Max): 0.50mm; Category: Resistor
footprint R0603
pins: 1, 2

## R-21.5R-0402
designator R?, comment Package: 0402  (hidden comment: 21.5R)
RES 21.5 OHM 1% 1/16W 0402; Manufacturer Part Number: RC0402FR-0721R5L; Manufacturer: YAGEO; Tolerance: 0.01; Power: 0.063W; Temperature Coefficient: ±100ppm/°C; Object  Type: Part; Design Item ID: R-21.5R-0402; Value: 21.5R; Composition: Thick Film; Features: Moisture Resistant; Operating Temperature: -55°C ~ 155°C; Height - Seated (Max): 0.40mm; Category: Resistor
footprint R0402
pins: 1, 2

## R-21.5R-0603
designator R?, comment Package: 0603  (hidden comment: 21.5R)
RES SMD 21.5 OHM 1% 1/10W 0603; Manufacturer Part Number: CRCW060321R5FKEA; Manufacturer: Vishay Dale; Tolerance: 0.01; Power: 0.1W; Temperature Coefficient: ±100ppm/°C; Object  Type: Part; Design Item ID: R-21.5R-0603; Value: 21.5R; Composition: Thick Film; Features: Automotive AEC-Q200; Operating Temperature: -55°C ~ 155°C; Height - Seated (Max): 0.50mm; Category: Resistor
footprint R0603
pins: 1, 2

## R-21K-0402
designator R?, comment Package: 0402  (hidden comment: 21K)
RES 21K OHM 1% 1/16W 0402; Manufacturer Part Number: RC0402FR-0721KL; Manufacturer: YAGEO; Tolerance: 0.01; Power: 0.063W; Temperature Coefficient: ±100ppm/°C; Object  Type: Part; Design Item ID: R-21K-0402; Value: 21K; Composition: Thick Film; Features: Moisture Resistant; Operating Temperature: -55°C ~ 155°C; Height - Seated (Max): 0.40mm; Category: Resistor
footprint R0402
pins: 1, 2

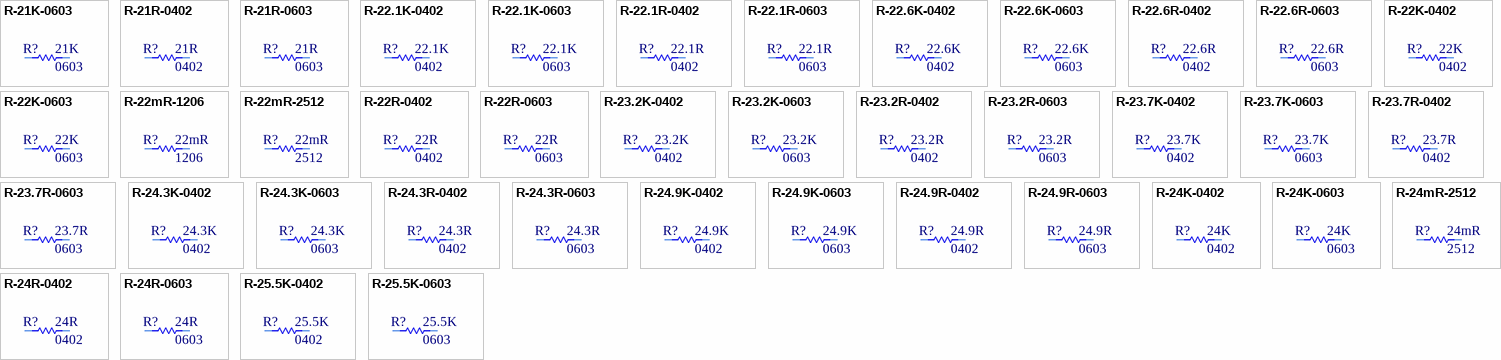
[diagram p61: symbols R-21K-0603 to R-25.5K-0603]

## R-21K-0603
designator R?, comment Package: 0603  (hidden comment: 21K)
RES SMD 21K OHM 1% 1/10W 0603; Manufacturer Part Number: CRCW060321K0FKEA; Manufacturer: Vishay Dale; Tolerance: 0.01; Power: 0.1W; Temperature Coefficient: ±100ppm/°C; Object  Type: Part; Design Item ID: R-21K-0603; Value: 21K; Composition: Thick Film; Features: Automotive AEC-Q200; Operating Temperature: -55°C ~ 155°C; Height - Seated (Max): 0.50mm; Category: Resistor
footprint R0603
pins: 1, 2

## R-21R-0402
designator R?, comment Package: 0402  (hidden comment: 21R)
RES 21 OHM 1% 1/16W 0402; Manufacturer Part Number: RC0402FR-0721RL; Manufacturer: YAGEO; Tolerance: 0.01; Power: 0.063W; Temperature Coefficient: ±100ppm/°C; Object  Type: Part; Design Item ID: R-21R-0402; Value: 21R; Composition: Thick Film; Features: Moisture Resistant; Operating Temperature: -55°C ~ 155°C; Height - Seated (Max): 0.40mm; Category: Resistor
footprint R0402
pins: 1, 2

## R-21R-0603
designator R?, comment Package: 0603  (hidden comment: 21R)
RES SMD 21 OHM 1% 1/10W 0603; Manufacturer Part Number: CRCW060321R0FKEA; Manufacturer: Vishay Dale; Tolerance: 0.01; Power: 0.1W; Temperature Coefficient: ±100ppm/°C; Object  Type: Part; Design Item ID: R-21R-0603; Value: 21R; Composition: Thick Film; Features: Automotive AEC-Q200; Operating Temperature: -55°C ~ 155°C; Height - Seated (Max): 0.50mm; Category: Resistor
footprint R0603
pins: 1, 2

## R-22.1K-0402
designator R?, comment Package: 0402  (hidden comment: 22.1K)
RES 22.1K OHM 1% 1/16W 0402; Manufacturer Part Number: RC0402FR-0722K1L; Manufacturer: YAGEO; Tolerance: 0.01; Power: 0.063W; Temperature Coefficient: ±100ppm/°C; Object  Type: Part; Design Item ID: R-22.1K-0402; Value: 22.1K; Composition: Thick Film; Features: Moisture Resistant; Operating Temperature: -55°C ~ 155°C; Height - Seated (Max): 0.40mm; Category: Resistor
footprint R0402
pins: 1, 2

## R-22.1K-0603
designator R?, comment Package: 0603  (hidden comment: 22.1K)
RES SMD 22.1K OHM 1% 1/10W 0603; Manufacturer Part Number: CRCW060322K1FKEA; Manufacturer: Vishay Dale; Tolerance: 0.01; Power: 0.1W; Temperature Coefficient: ±100ppm/°C; Object  Type: Part; Design Item ID: R-22.1K-0603; Value: 22.1K; Composition: Thick Film; Features: Automotive AEC-Q200; Operating Temperature: -55°C ~ 155°C; Height - Seated (Max): 0.50mm; Category: Resistor
footprint R0603
pins: 1, 2

## R-22.1R-0402
designator R?, comment Package: 0402  (hidden comment: 22.1R)
RES 22.1 OHM 1% 1/16W 0402; Manufacturer Part Number: RC0402FR-0722R1L; Manufacturer: YAGEO; Tolerance: 0.01; Power: 0.063W; Temperature Coefficient: ±100ppm/°C; Object  Type: Part; Design Item ID: R-22.1R-0402; Value: 22.1R; Composition: Thick Film; Features: Moisture Resistant; Operating Temperature: -55°C ~ 155°C; Height - Seated (Max): 0.40mm; Category: Resistor
footprint R0402
pins: 1, 2

## R-22.1R-0603
designator R?, comment Package: 0603  (hidden comment: 22.1R)
RES SMD 22.1 OHM 1% 1/10W 0603; Manufacturer Part Number: CRCW060322R1FKEA; Manufacturer: Vishay Dale; Tolerance: 0.01; Power: 0.1W; Temperature Coefficient: ±100ppm/°C; Object  Type: Part; Design Item ID: R-22.1R-0603; Value: 22.1R; Composition: Thick Film; Features: Automotive AEC-Q200; Operating Temperature: -55°C ~ 155°C; Height - Seated (Max): 0.50mm; Category: Resistor
footprint R0603
pins: 1, 2

## R-22.6K-0402
designator R?, comment Package: 0402  (hidden comment: 22.6K)
RES 22.6K OHM 1% 1/16W 0402; Manufacturer Part Number: RC0402FR-0722K6L; Manufacturer: YAGEO; Tolerance: 0.01; Power: 0.063W; Temperature Coefficient: ±100ppm/°C; Object  Type: Part; Design Item ID: R-22.6K-0402; Value: 22.6K; Composition: Thick Film; Features: Moisture Resistant; Operating Temperature: -55°C ~ 155°C; Height - Seated (Max): 0.40mm; Category: Resistor
footprint R0402
pins: 1, 2

## R-22.6K-0603
designator R?, comment Package: 0603  (hidden comment: 22.6K)
RES SMD 22.6K OHM 1% 1/10W 0603; Manufacturer Part Number: CRCW060322K6FKEA; Manufacturer: Vishay Dale; Tolerance: 0.01; Power: 0.1W; Temperature Coefficient: ±100ppm/°C; Object  Type: Part; Design Item ID: R-22.6K-0603; Value: 22.6K; Composition: Thick Film; Features: Automotive AEC-Q200; Operating Temperature: -55°C ~ 155°C; Height - Seated (Max): 0.50mm; Category: Resistor
footprint R0603
pins: 1, 2

## R-22.6R-0402
designator R?, comment Package: 0402  (hidden comment: 22.6R)
RES 22.6 OHM 1% 1/16W 0402; Manufacturer Part Number: RC0402FR-0722R6L; Manufacturer: YAGEO; Tolerance: 0.01; Power: 0.063W; Temperature Coefficient: ±100ppm/°C; Object  Type: Part; Design Item ID: R-22.6R-0402; Value: 22.6R; Composition: Thick Film; Features: Moisture Resistant; Operating Temperature: -55°C ~ 155°C; Height - Seated (Max): 0.40mm; Category: Resistor
footprint R0402
pins: 1, 2

## R-22.6R-0603
designator R?, comment Package: 0603  (hidden comment: 22.6R)
RES SMD 22.6 OHM 1% 1/10W 0603; Manufacturer Part Number: CRCW060322R6FKEA; Manufacturer: Vishay Dale; Tolerance: 0.01; Power: 0.1W; Temperature Coefficient: ±100ppm/°C; Object  Type: Part; Design Item ID: R-22.6R-0603; Value: 22.6R; Composition: Thick Film; Features: Automotive AEC-Q200; Operating Temperature: -55°C ~ 155°C; Height - Seated (Max): 0.50mm; Category: Resistor
footprint R0603
pins: 1, 2

## R-22K-0402
designator R?, comment Package: 0402  (hidden comment: 22K)
RES 22K OHM 1% 1/16W 0402; Manufacturer Part Number: RC0402FR-0722KL; Manufacturer: YAGEO; Tolerance: 0.01; Power: 0.063W; Temperature Coefficient: ±100ppm/°C; Object  Type: Part; Design Item ID: R-22K-0402; Value: 22K; Composition: Thick Film; Features: Moisture Resistant; Operating Temperature: -55°C ~ 155°C; Height - Seated (Max): 0.40mm; Category: Resistor
footprint R0402
pins: 1, 2